# Altium footprint library self_pcblib v1.8.6.PcbLib: 164 footprints (part 8 of 11)
Each footprint in its own frame and in the unit in brackets; x right, y up, seen from the top. Pads: shape width x height; smd on the part's side, far side on the other; paste and mask are expansions set on the pad; w line width, h text height; cw(c..) or ccw(c..) is an arc to the next point about the centre after c.
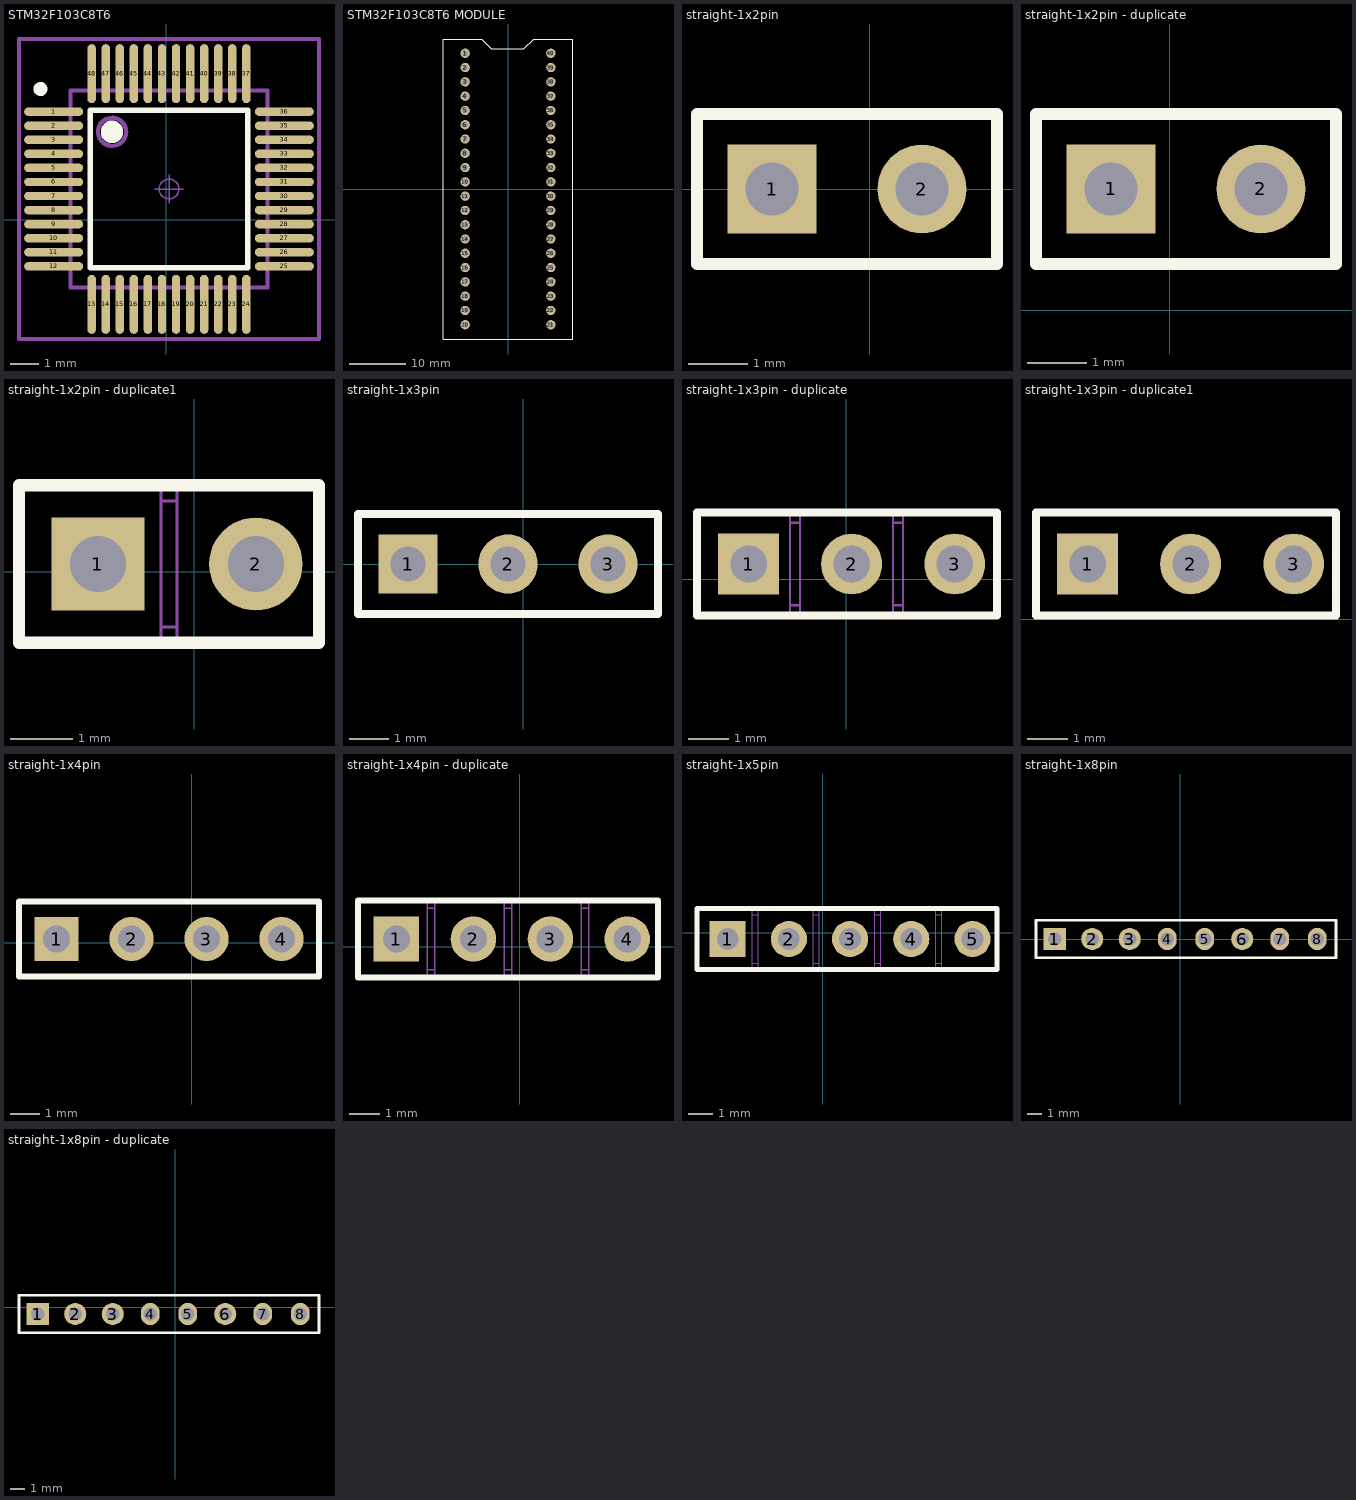
[diagram p7: the footprints below, top view; thin cyan lines are the x and y axes]

## STM32F103C8T6 [mm]
pads (48):
  oval 2.1x0.3 smd: 1(-4.008,3.836) 2(-4.008,3.336) 3(-4.008,2.836) 4(-4.008,2.336) 5(-4.008,1.836) 6(-4.008,1.336) 7(-4.008,0.836) 8(-4.008,0.336) 9(-4.008,-0.164) 10(-4.008,-0.664) 11(-4.008,-1.164) 12(-4.008,-1.664) 25(4.192,-1.664) 26(4.192,-1.164) 27(4.192,-0.664) 28(4.192,-0.164) 29(4.192,0.336) 30(4.192,0.836) 31(4.192,1.336) 32(4.192,1.836) 33(4.192,2.336) 34(4.192,2.836) 35(4.192,3.336) 36(4.192,3.836)
  oval 0.3x2.1 smd: 13(-2.658,-3.014) 14(-2.158,-3.014) 15(-1.658,-3.014) 16(-1.158,-3.014) 17(-0.658,-3.014) 18(-0.158,-3.014) 19(0.342,-3.014) 20(0.842,-3.014) 21(1.342,-3.014) 22(1.842,-3.014) 23(2.342,-3.014) 24(2.842,-3.014) 37(2.842,5.186) 38(2.342,5.186) 39(1.842,5.186) 40(1.342,5.186) 41(0.842,5.186) 42(0.342,5.186) 43(-0.158,5.186) 44(-0.658,5.186) 45(-1.158,5.186) 46(-1.658,5.186) 47(-2.158,5.186) 48(-2.658,5.186)
Top Overlay:
  circle w0.6: c-1.935,3.118 r0.1
  circle w0.25: c-4.48,4.642 r0.125
  lines w0.2: -2.702,-1.708 2.886,-1.708 2.886,3.88 -2.702,3.88 -2.702,-1.708
Mechanical 13:
  circle w0.15: c-1.932,3.118 r0.5
  lines w0.15: -3.408,-2.414 3.592,-2.414 3.592,4.586 -3.408,4.586 -3.408,-2.414
Mechanical 15:
  circle w0.05: c0.092,1.086 r0.35
  lines w0.05: -0.408,1.086 0.592,1.086 ; 0.092,0.586 0.092,1.586
  lines w0.15: -5.242,-4.248 5.426,-4.248 5.426,6.42 -5.242,6.42 -5.242,-4.248
3D body "LQFP48-7x7.STEP": height 1.45, standoff 0, extent -4.408,-3.414 4.592,5.586

## STM32F103C8T6 MODULE [mil]
pads (40):
  round 65 hole 39: 1(-300,950) 2(-300,850) 3(-300,750) 4(-300,650) 5(-300,550) 6(-300,450) 7(-300,350) 8(-300,250) 9(-300,150) 10(-300,50) 11(-300,-50) 12(-300,-150) 13(-300,-250) 14(-300,-350) 15(-300,-450) 16(-300,-550) 17(-300,-650) 18(-300,-750) 19(-300,-850) 20(-300,-950) 21(300,-950) 22(300,-850) 23(300,-750) 24(300,-650) 25(300,-550) 26(300,-450) 27(300,-350) 28(300,-250) 29(300,-150) 30(300,-50) 31(300,50) 32(300,150) 33(300,250) 34(300,350) 35(300,450) 36(300,550) 37(300,650) 38(300,750) 39(300,850) 40(300,950)
Top Overlay:
  lines w8: -452.76,-1050 452.76,-1050 452.76,1050 179.33,1050 110.83,981.5 -116.34,981.5 -184.84,1050 -452.76,1050 -452.76,-1050
3D body "User Library-BluePill.STEP": height 768.11, standoff 81.85, extent -442.91,-1239 442.91,1069.52

## straight-1x2pin [mm]
pads (2):
  rect 1.5x1.5 hole 0.9: 1(-1.651,0)
  round 1.5 hole 0.9: 2(0.889,0)
Top Overlay:
  lines w0.2: -2.921,-1.27 -2.921,1.27 2.159,1.27 2.159,-1.27 -2.921,-1.27
3D body "1001-2.STEP": height 8.54, standoff -3, extent -2.921,-1.27 2.159,1.27

## straight-1x2pin - duplicate [mm]
pads (2):
  rect 1.5x1.5 hole 0.9: 1(-0.991,2.057)
  round 1.5 hole 0.9: 2(1.549,2.057)
Top Overlay:
  lines w0.2: -2.261,0.787 2.819,0.787 2.819,3.327 -2.261,3.327 -2.261,0.787
3D body "User Library-1x2 TH Pitch 2_54mm.STEP": height 9.5, standoff -3.2, extent -2.21,0.737 2.87,3.277

## straight-1x2pin - duplicate1 [mm]
pads (2):
  rect 1.5x1.5 hole 0.9: 1(-1.549,0.127)
  round 1.5 hole 0.9: 2(0.991,0.127)
Top Overlay:
  lines w0.2: -2.819,-1.143 2.007,-1.143 2.007,1.397 -0.914,1.397 -2.819,1.397 -2.819,-1.143
Mechanical 1:
  lines w0.05: -0.533,-0.889 -0.279,-0.889 ; -0.533,1.143 -0.279,1.143 ; -2.819,-1.143 -2.819,1.397 -0.533,1.397 -0.533,-1.143 -2.819,-1.143 ; -0.279,-1.143 2.007,-1.143 2.007,1.397 -0.279,1.397 -0.279,-1.143
3D body: height 4, standoff 0, extent -1.896,-0.222 -1.199,0.477
3D body: height 4, standoff 0, extent 0.644,-0.222 1.341,0.477
3D body: height 4, standoff 0, extent 0.644,-0.222 1.341,0.477
3D body: height 4, standoff 0, extent -1.897,-0.222 -1.199,0.476
3D body: height 1.5, standoff 0.2, extent -0.533,-0.889 -0.279,1.143
3D body: height 1.7, standoff 0.2, extent -0.279,-1.143 2.007,1.397
3D body: height 1.7, standoff 0.2, extent -2.819,-1.143 -0.533,1.397

## straight-1x3pin [mm]
pads (3):
  rect 1.5x1.5 hole 0.9: 1(-2.921,0)
  round 1.5 hole 0.9: 2(-0.381,0) 3(2.159,0)
Top Overlay:
  lines w0.2: -4.191,-1.27 3.429,-1.27 3.429,1.27 -4.191,1.27 -4.191,-1.27
3D body "1001-3.STEP": height 8.54, standoff -3, extent -4.191,-1.27 3.429,1.27

## straight-1x3pin - duplicate [mm]
pads (3):
  rect 1.5x1.5 hole 0.9: 1(-2.413,0.381)
  round 1.5 hole 0.9: 2(0.127,0.381) 3(2.667,0.381)
Top Overlay:
  lines w0.2: -3.683,-0.889 3.708,-0.889 3.708,1.651 -1.778,1.651 -3.683,1.651 -3.683,-0.889
Mechanical 1:
  lines w0.05: -1.397,-0.635 -1.143,-0.635 ; -1.397,1.397 -1.143,1.397 ; 1.143,-0.635 1.397,-0.635 ; 1.143,1.397 1.397,1.397 ; -3.683,-0.889 -3.683,1.651 -1.397,1.651 -1.397,-0.889 -3.683,-0.889 ; -1.143,-0.889 1.143,-0.889 1.143,1.651 -1.143,1.651 -1.143,-0.889 ; 1.397,-0.889 3.683,-0.889 3.683,1.651 1.397,1.651 1.397,-0.889
3D body: height 4, standoff 0, extent -2.76,0.032 -2.063,0.731
3D body: height 4, standoff 0, extent -0.22,0.032 0.477,0.731
3D body: height 4, standoff 0, extent 2.32,0.032 3.017,0.731
3D body: height 4, standoff 0, extent 2.32,0.032 3.017,0.731
3D body: height 4, standoff 0, extent -0.22,0.032 0.477,0.731
3D body: height 4, standoff 0, extent -2.76,0.032 -2.063,0.73
3D body: height 1.5, standoff 0.2, extent 1.143,-0.635 1.397,1.397
3D body: height 1.5, standoff 0.2, extent -1.397,-0.635 -1.143,1.397
3D body: height 1.7, standoff 0.2, extent 1.397,-0.889 3.683,1.651
3D body: height 1.7, standoff 0.2, extent -1.143,-0.889 1.143,1.651
3D body: height 1.7, standoff 0.2, extent -3.683,-0.889 -1.397,1.651

## straight-1x3pin - duplicate1 [mm]
pads (3):
  rect 1.5x1.5 hole 0.9: 1(-9.266,1.365)
  round 1.5 hole 0.9: 2(-6.726,1.365) 3(-4.186,1.365)
Top Overlay:
  lines w0.2: -10.536,0.095 -10.536,2.635 -8.631,2.635 -3.144,2.635 -3.144,0.095 -10.536,0.095
Mechanical 1:
  lines w0.05: -8.25,0.095 -10.536,0.095 -10.536,2.635 -8.25,2.635 ; -7.996,0.095 -5.71,0.095 ; -7.996,2.635 -5.71,2.635 ; -5.456,0.095 -3.17,0.095 -3.17,2.635 -5.456,2.635
3D body "User Library-1x3 TH Pitch 2_54mm.STEP": height 9.5, standoff -3.2, extent -10.668,0.095 -3.048,2.635

## straight-1x4pin [mm]
pads (4):
  rect 1.5x1.5 hole 0.9: 1(-4.572,0.127)
  round 1.5 hole 0.9: 2(-2.032,0.127) 3(0.508,0.127) 4(3.048,0.127)
Top Overlay:
  lines w0.2: -5.842,-1.143 4.318,-1.143 4.318,1.397 -5.842,1.397 -5.842,-1.143
3D body "1001-4.STEP": height 8.54, standoff -3, extent -5.842,-1.143 4.318,1.397

## straight-1x4pin - duplicate [mm]
pads (4):
  rect 1.5x1.5 hole 0.9: 1(-4.064,0.254)
  round 1.5 hole 0.9: 2(-1.524,0.254) 3(1.016,0.254) 4(3.556,0.254)
Top Overlay:
  lines w0.2: -5.334,-1.016 4.572,-1.016 4.572,1.524 -3.429,1.524 -5.334,1.524 -5.334,-1.016
Mechanical 1:
  lines w0.05: -3.048,-0.762 -2.794,-0.762 ; -3.048,1.27 -2.794,1.27 ; -0.508,-0.762 -0.254,-0.762 ; -0.508,1.27 -0.254,1.27 ; 2.032,-0.762 2.286,-0.762 ; 2.032,1.27 2.286,1.27 ; -5.334,-1.016 -5.334,1.524 -3.048,1.524 -3.048,-1.016 -5.334,-1.016 ; -2.794,-1.016 -0.508,-1.016 -0.508,1.524 -2.794,1.524 -2.794,-1.016 ; -0.254,-1.016 2.032,-1.016 2.032,1.524 -0.254,1.524 -0.254,-1.016 ; 2.286,-1.016 4.572,-1.016 4.572,1.524 2.286,1.524 2.286,-1.016
3D body: height 4, standoff 0, extent -4.411,-0.095 -3.714,0.604
3D body: height 4, standoff 0, extent -1.871,-0.095 -1.174,0.604
3D body: height 4, standoff 0, extent 0.669,-0.095 1.366,0.604
3D body: height 4, standoff 0, extent 3.209,-0.095 3.906,0.604
3D body: height 4, standoff 0, extent 3.209,-0.095 3.906,0.604
3D body: height 4, standoff 0, extent 0.669,-0.095 1.366,0.604
3D body: height 4, standoff 0, extent -1.871,-0.095 -1.174,0.604
3D body: height 4, standoff 0, extent -4.411,-0.095 -3.714,0.603
3D body: height 1.5, standoff 0.2, extent 2.032,-0.762 2.286,1.27
3D body: height 1.5, standoff 0.2, extent -0.508,-0.762 -0.254,1.27
3D body: height 1.5, standoff 0.2, extent -3.048,-0.762 -2.794,1.27
3D body: height 1.7, standoff 0.2, extent 2.286,-1.016 4.572,1.524
3D body: height 1.7, standoff 0.2, extent -0.254,-1.016 2.032,1.524
3D body: height 1.7, standoff 0.2, extent -2.794,-1.016 -0.508,1.524
3D body: height 1.7, standoff 0.2, extent -5.334,-1.016 -3.048,1.524

## straight-1x5pin [mm]
pads (5):
  rect 1.5x1.5 hole 0.9: 1(-3.937,-0.254)
  round 1.5 hole 0.9: 2(-1.397,-0.254) 3(1.143,-0.254) 4(3.683,-0.254) 5(6.223,-0.254)
Top Overlay:
  lines w0.2: -5.207,-1.524 7.239,-1.524 7.239,1.016 -3.302,1.016 -5.207,1.016 -5.207,-1.524
Mechanical 1:
  lines w0.05: -2.921,-1.27 -2.667,-1.27 ; -2.921,0.762 -2.667,0.762 ; -0.381,-1.27 -0.127,-1.27 ; -0.381,0.762 -0.127,0.762 ; 2.159,-1.27 2.413,-1.27 ; 2.159,0.762 2.413,0.762 ; 4.699,-1.27 4.953,-1.27 ; 4.699,0.762 4.953,0.762 ; 7.239,-1.524 4.953,-1.524 4.953,1.016 7.239,1.016 ; -5.207,-1.524 -5.207,1.016 -2.921,1.016 -2.921,-1.524 -5.207,-1.524 ; -2.667,-1.524 -0.381,-1.524 -0.381,1.016 -2.667,1.016 -2.667,-1.524 ; -0.127,-1.524 2.159,-1.524 2.159,1.016 -0.127,1.016 -0.127,-1.524 ; 2.413,-1.524 4.699,-1.524 4.699,1.016 2.413,1.016 2.413,-1.524
3D body: height 4, standoff 0, extent -4.284,-0.603 -3.587,0.096
3D body: height 4, standoff 0, extent -1.744,-0.603 -1.047,0.096
3D body: height 4, standoff 0, extent 0.796,-0.603 1.493,0.096
3D body: height 4, standoff 0, extent 3.336,-0.603 4.033,0.096
3D body: height 4, standoff 0, extent 5.876,-0.603 6.573,0.095
3D body: height 4, standoff 0, extent 5.876,-0.603 6.573,0.096
3D body: height 4, standoff 0, extent 3.336,-0.603 4.033,0.096
3D body: height 4, standoff 0, extent 0.796,-0.603 1.493,0.096
3D body: height 4, standoff 0, extent -1.744,-0.603 -1.047,0.096
3D body: height 4, standoff 0, extent -4.284,-0.603 -3.587,0.095
3D body: height 1.5, standoff 0.2, extent 4.699,-1.27 4.953,0.762
3D body: height 1.5, standoff 0.2, extent 2.159,-1.27 2.413,0.762
3D body: height 1.5, standoff 0.2, extent -0.381,-1.27 -0.127,0.762
3D body: height 1.5, standoff 0.2, extent -2.921,-1.27 -2.667,0.762
3D body: height 1.7, standoff 0.2, extent 4.953,-1.524 7.239,1.016
3D body: height 1.7, standoff 0.2, extent 2.413,-1.524 4.699,1.016
3D body: height 1.7, standoff 0.2, extent -0.127,-1.524 2.159,1.016
3D body: height 1.7, standoff 0.2, extent -2.667,-1.524 -0.381,1.016
3D body: height 1.7, standoff 0.2, extent -5.207,-1.524 -2.921,1.016

## straight-1x8pin [mm]
pads (8):
  rect 1.5x1.5 hole 0.9: 1(-8.509,0)
  round 1.5 hole 0.9: 2(-5.969,0) 3(-3.429,0) 6(4.191,0)
  oval 1.27x1.5 hole 0.9: 4(-0.889,0) 5(1.651,0) 7(6.731,0) 8(9.271,0)
Top Overlay:
  lines w0.2: -9.779,-1.27 10.541,-1.27 10.541,1.27 -9.779,1.27 -9.779,-1.27
3D body "8 pin strip.STEP": height 0.7, standoff -10.9, extent -9.779,-1.27 10.541,1.27

## straight-1x8pin - duplicate [mm]
pads (8):
  rect 1.5x1.5 hole 0.9: 1(-9.296,-0.457)
  round 1.5 hole 0.9: 2(-6.756,-0.457) 3(-4.216,-0.457) 6(3.404,-0.457)
  oval 1.27x1.5 hole 0.9: 4(-1.676,-0.457) 5(0.864,-0.457) 7(5.944,-0.457) 8(8.484,-0.457)
Top Overlay:
  lines w0.2: -10.566,-1.727 9.754,-1.727 9.754,0.813 -10.566,0.813 -10.566,-1.727
3D body "65793.stp": height 7.27, standoff -4.27, extent -10.643,-1.753 9.677,0.787

## straight-2x2pin [mm]

## straight-2x3pin [mm]

## straight-2x4pin [mm]